# Altium integrated library sonata-board.IntLib: 101 symbols (continued)
## CMP-2000-05795-3 (continued)
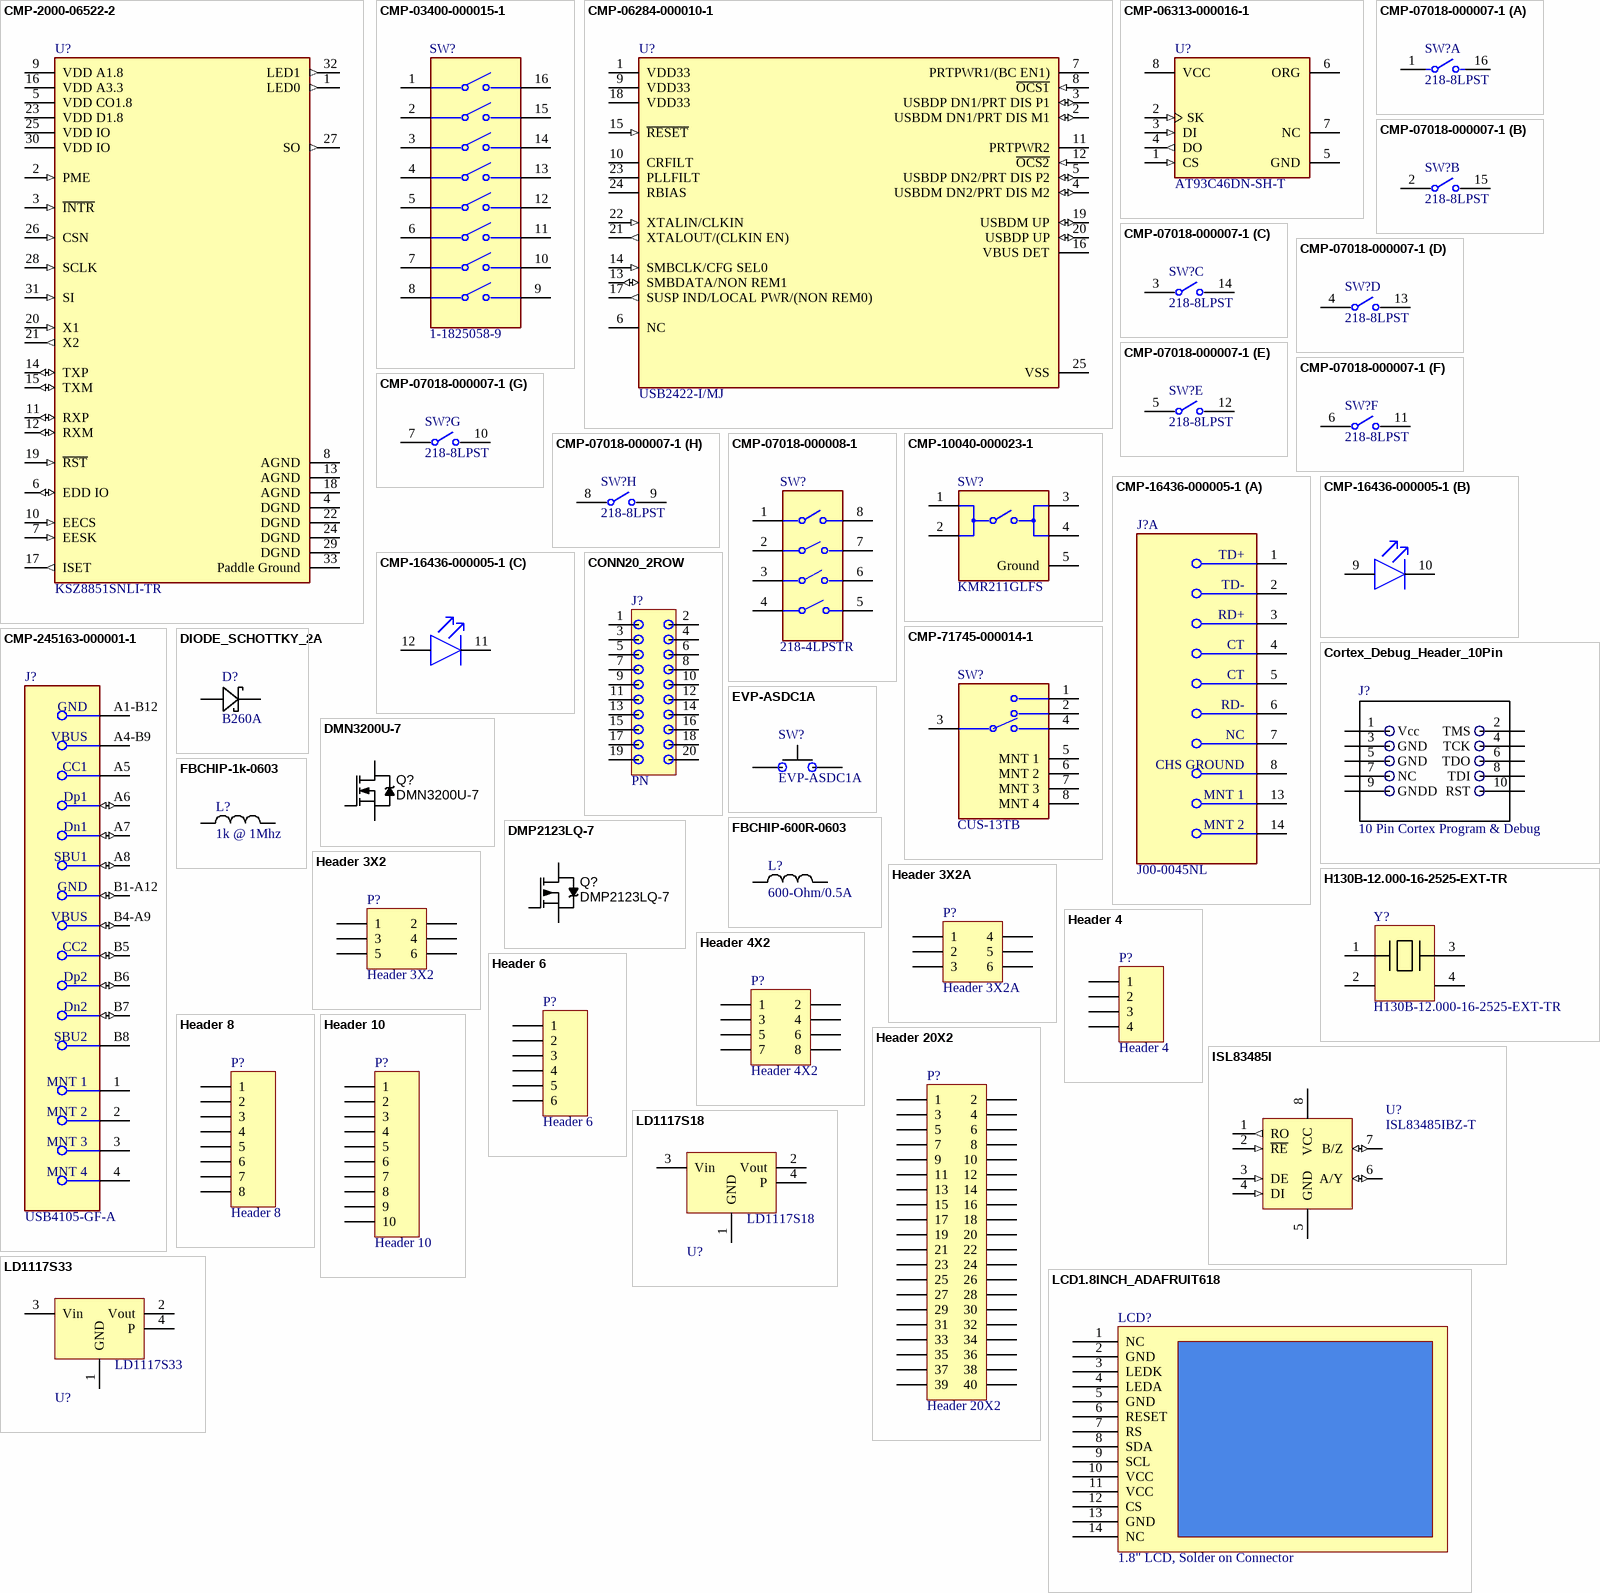
[diagram p2: symbols CMP-2000-06522-2 to LD1117S33]

## CMP-2000-06522-2
designator U?, comment KSZ8851SNLI-TR
IC ETHERNET CTLR 1PORT PCI 32MLF; Manufacturer: Microchip; Manufacturer Part Number: KSZ8851SNLITR; Data Rate: 100Mbps; Interface: SPI; Nominal Supply Current: 75mA; Max Supply Voltage: 3.5V; Number of Functions: 1; Operating Supply Voltage: 3.3V; Min Supply Voltage: 3.1V; Max Supply Current: 85mA; Height: 0.85mm; Package Quantity: 1000; Series: -; Max Operating Temperature: 85°C; Packaging: Tape and Reel; Case/Package: QFN; Radiation Hardening: No; Lead Free: Lead Free; REACH SVHC: No SVHC; Number of Transceivers: 1; Number of Pins: 32; Min Operating Temperature: -40°C; Supply Current: 75mA; Length: 5mm; Width: 5mm; Supply Voltage-Nom: 3.3V; Number of Ports: 1; Mount: Surface Mount
footprint FP-QFN55-32LD-PL-5-IPC_C
footprint FP-QFN55-32LD-PL-5-IPC_B
footprint FP-QFN55-32LD-PL-5-MFG
footprint FP-QFN55-32LD-PL-5-IPC_A
pins: 1 LED0 (out), 2 PME (in), 3 ~{INTR} (in), 4 DGND (power), 5 VDD CO1.8 (power), 6 EDD IO (io), 7 EESK (in), 8 AGND (power), 9 VDD A1.8 (power), 10 EECS (in), 11 RXP (io), 12 RXM (io), 13 AGND (power), 14 TXP (io), 15 TXM (io), 16 VDD A3.3 (power), 17 ISET (out), 18 AGND (power), 19 ~{RST} (in), 20 X1 (in), 21 X2 (out), 22 DGND (power), 23 VDD D1.8 (power), 24 DGND (power), 25 VDD IO (power), 26 CSN (in), 27 SO (out), 28 SCLK (in), 29 DGND (power), 30 VDD IO (power), 31 SI (in), 32 LED1 (out), 33 Paddle Ground

## CMP-03400-000015-1
designator SW?, comment 1-1825058-9
SWITCH SLIDE DIP SPST 100MA 24V; Manufacturer: TE Connectivity; Current Rating: 1A; Electromechanical Life: 1000Cycles; Contact Resistance: 50mΩ; Number Of Circuits: 8; Device Class L1: Electromechanical; Manufacturer Part Number: 1-1825058-9; Height: 5.1mm; ComponentLink2Description: Datasheet; Temperature Range High: +85°C; Digikey Description: SWITCH SLIDE DIP SPST 100MA 24V; Voltage Rating Dc: 24V; Package: 0; Automotive: No; ComponentLink2URL: https://www.te.com/commerce/DocumentDelivery/DDEController?Action=showdoc&DocId=Customer+Drawing%7F1825058%7FS5%7Fpdf%7FEnglish%7FENG_CD_1825058_S5.pdf%7F1-1825058-9; Octopart: https://octopart.com/1-1825058-9-te+connectivity-46507285; Temperature Range Low: -30°C; Device Class L2: Switches; Contact Current Rating: 100mA; Mount: Surface Mount; Temperature: -30°C to +85°C; Category: Switch; Device Class L3: DIP Switches; Lead Free: Yes; Throw Configuration: SPST; RoHS: TRUE
footprint FP-1-1825058-9-MFG
pins: 1, 2, 3, 4, 5, 6, 7, 8, 9, 10, 11, 12, 13, 14, 15, 16

## CMP-06284-000010-1
designator U?, comment USB2422-I/MJ
IC HUB CTLR USB 2.0 24QFN; Manufacturer: Microchip; Min Supply Voltage: 3V; Standoff Height: 0mm; Usb Standard: USB 2.0; Interface: I2C,USB,SMBus; Number Of Ports: 2; Max Supply Voltage: 3.6V; Nominal Supply Current: 29-70mA; Device Class L1: Integrated Circuits (ICs); ComponentLink2URL: http://ww1.microchip.com/downloads/en/DeviceDoc/00001726B.pdf; Temperature: -40°C to +85°C; Lead Free: Yes; Category: IC; RoHS: TRUE; Digikey Description: IC HUB CTLR USB 2.0 24QFN; Device Class L2: Interface ICs; Height: 1mm; Device Class L3: USB Interface ICs; Temperature Range High: +85°C; Automotive: No; Ipc Land Pattern Name: QFN50P400X400X90-24; Temperature Range Low: -40°C; Manufacturer Part Number: USB2422-I/MJ; Mouser Description: Microchip USB2422-I/MJ; USB Controller; USB 2.0; 3 - 3.6 V; 24-Pin SQFN; Package: 24-S4QFN-4x4B-0.5P; Ambient Temperature Range Low: -40°C; ComponentLink2Description: Datasheet; Ambient Temperature Range High: +85°C; Octopart: https://octopart.com/usb2422-i%2Fmj-microchip-29030614
footprint FP-24-S4QFN-4x4B-0_5P-MFG
footprint FP-24-S4QFN-4x4B-0_5P-IPC_C
footprint FP-24-S4QFN-4x4B-0_5P-IPC_B
footprint FP-24-S4QFN-4x4B-0_5P-IPC_A
pins: 1 VDD33 (power), 2 USBDM DN1/PRT DIS M1 (io), 3 USBDP DN1/PRT DIS P1 (io), 4 USBDM DN2/PRT DIS M2 (io), 5 USBDP DN2/PRT DIS P2 (io), 6 NC, 7 PRTPWR1/(BC EN1) (power), 8 ~{OCS1} (in), 9 VDD33 (power), 10 CRFILT, 11 PRTPWR2 (power), 12 ~{OCS2} (in), 13 SMBDATA/NON REM1 (io), 14 SMBCLK/CFG SEL0 (in), 15 ~{RESET} (in), 16 VBUS DET (power), 17 SUSP IND/LOCAL PWR/(NON REM0) (out), 18 VDD33 (power), 19 USBDM UP (io), 20 USBDP UP (io), 21 XTALOUT/(CLKIN EN) (out), 22 XTALIN/CLKIN (in), 23 PLLFILT, 24 RBIAS, 25 VSS (power)

## CMP-06313-000016-1
designator U?, comment AT93C46DN-SH-T
IC EEPROM 1K SPI 2MHZ 8SOIC; Manufacturer: Microchip; Manufacturer: Microchip / Atmel; Nominal Supply Current: 0.5mA; Memory Size: 1Kbits; Access Time: 1000ns; Max Supply Voltage: 5.5V; Interface: Other; Standoff Height: 0.1mm; Min Supply Voltage: 1.8V; Category: IC; Temperature Range High: +85°C; Mouser Description: EEPROM Serial-3Wire 1K-Bit 128 x 8/64 x 16 2.5V/3.3V/5V 8-Pin SOIC T/R; Ipc Land Pattern Name: SOIC127P600X175-8; Temperature Range Low: -40°C; Temperature: -40°C to +85°C; Digikey Description: IC EEPROM 1K SPI 2MHZ 8SOIC; Lead Free: Yes; Device Class L2: Memory; ComponentLink2URL: http://ww1.microchip.com/downloads/en/DeviceDoc/20006224B.pdf; Automotive: No; Device Class L3: EEPROM; Package: C04-057-SN; Octopart: https://octopart.com/at93c46dn-sh-t-microchip-77759177; RoHS: TRUE; Memory Type: EEPROM; Height: 1.75mm; Manufacturer Part Number: AT93C46DN-SH-T; ComponentLink2Description: Datasheet; Frequency: 2MHz; Device Class L1: Integrated Circuits (ICs)
footprint FP-C04-057-SN-MFG
footprint FP-C04-057-SN-IPC_C
footprint FP-C04-057-SN-IPC_B
footprint FP-C04-057-SN-IPC_A
pins: 1 CS (in), 2 SK (in), 3 DI (in), 4 DO (out), 5 GND (power), 6 ORG, 7 NC, 8 VCC (power)

## CMP-07018-000007-1
designator SW?, comment 218-8LPST
SWITCH SLIDE DIP SPST 25MA 24V; Manufacturer: CTS; Number of Positions: 8; Pitch: 0.05inch; Actuator Type: Slide (Standard); Electrical Life: 1000Cycles; Washable: Yes; Contact Resistance: 100mR; Radiation Hardening: No; Packaging: Rail/Tube; Length: 0.446inch; Depth: 8.44mm; Max Voltage Rating (DC): 24V; Lead Free: Lead Free; Mount: Surface Mount; RoHS Compliant: Yes; Series: 218; Max Operating Temperature: 85°C; Termination: Gull Wing; Voltage Rating (DC): 24V; Current Rating: 25mA; Contact Plating: Gold; Min Operating Temperature: -55°C; Terminal Pitch: 1.27mm; Contact Material: Copper; Throw Configuration: SPST; Orientation: Straight; Max Current Rating: 25mA; Height: 2.65mm; Package Quantity: 40; Manufacturer Part Number: 218-8LPST
footprint FP-218-8LPST-MFG
part A pins: 1, 16
part B pins: 2, 15
part C pins: 3, 14
part D pins: 4, 13
part E pins: 5, 12
part F pins: 6, 11
part G pins: 7, 10
part H pins: 8, 9

## CMP-07018-000008-1
designator SW?, comment 218-4LPSTR
SWITCH SLIDE DIP SPST 25MA 24V; Manufacturer: CTS; Number of Positions: 4; Washable: Yes; Pitch: 0.05inch; Actuator Type: Slide (Standard); Electrical Life: 1000Cycles; Current Rating: 25mA; Contact Material: Copper; Max Current Rating: 25mA; Termination: Gull Wing; Throw Configuration: SPST; Mount: Surface Mount; Radiation Hardening: No; Contact Plating: Gold; Length: 0.246inch; Depth: 8.44mm; Package Quantity: 2000; Packaging: Tape and Reel; Series: 218; Lead Free: Lead Free; Voltage Rating (DC): 24V; Min Operating Temperature: -55°C; RoHS Compliant: Yes; Mechanical Life: 1000Cycles; Max Operating Temperature: 85°C; Orientation: Straight; Max Voltage Rating (DC): 24V; Manufacturer Part Number: 218-4LPSTR
footprint FP-218-4LPSTR-MFG
pins: 1, 2, 3, 4, 5, 6, 7, 8

## CMP-10040-000023-1
designator SW?, comment KMR211GLFS
SWITCH TACTILE SPST-NO 0.05A 32V; Manufacturer: ITT C&K; Switch Function: Off-Mom; Throw Configuration: SPST; Switch Travel: 0.2mm; Current Rating: 50mA; Illumination Type: Non-Illuminated; Actuator Length: 0.5mm; Power Rating: 1W; Operating Force: 1.2N; Actuator Type: Standard; Mechanical Life: 200000Cycles; REACH SVHC: No SVHC; Voltage Rating (DC): 32V; Length: 2.8mm; Min Operating Temperature: -40°C; Mount: Surface Mount; Max Voltage Rating (DC): 32V; Width: 2.8mm; Depth: 4.6mm; Packaging: Tape and Reel; Lead Free: Lead Free; Contact Material: Silver; Termination: Gull Wing; Package Quantity: 1; Contact Current Rating: 50mA; Orientation: Straight; Max Operating Temperature: 85°C; Radiation Hardening: No; Max Current Rating: 50mA; Contact Plating: Silver; Manufacturer Part Number: KMR211GLFS
footprint FP-KMR211GLFS-MFG
pins: 1, 2, 3, 4, 5 Ground (power)

## CMP-16436-000005-1
designator J?, comment J00-0045NL
CONN JACK 1PORT 100 BASE-TX PCB; Manufacturer: Pulse; Manufacturer Part Number: J000045NL; Number of Cores per Jack: 4; Gender: Female; Connector Type: RJ45; Number of Positions Loaded: 8; Current Rating: 8mA; Pitch: 2.54mm; Shielding: Shielded; Direction: Down; Number of Ports: 1; Depth: 21.59mm; Radiation Hardening: No; Contact Material: Bronze; Contact Plating: Gold; Mount: Through Hole; Max Operating Temperature: 70°C; Packaging: Rail/Tube; Color: Green; Number of Contacts: 8; Lead Free: Lead Free; Series: STARJACK™ J00; Package Quantity: 30; Length: 16.26mm; Number of Rows: 1; Min Operating Temperature: 0°C; Termination: Solder; Orientation: Right Angle; Housing Material: Thermoplastic
footprint FP-J00-0045NL-MFG
part A pins: 1 TD+, 2 TD-, 3 RD+, 4 CT, 5 CT, 6 RD-, 7 NC, 8 CHS GROUND, 13 MNT 1, 14 MNT 2
part B pins: 9 GREEN A, 10 GREEN C
part C pins: 11 YELLOW CATHODE, 12 YELLOW ANODE

## CMP-71745-000014-1
designator SW?, comment CUS-13TB
SWITCH SLIDE SP3T 300MA 4V; Manufacturer: Nidec Copal; Actuator Length: 1.5mm; Electrical Life: 10000Cycles; Max Voltage Rating (DC): 20V; Switch Function: On-On-On; Actuator Material: Nylon; Actuator Type: Standard; Contact Style: Non-Shorting; Contact Plating: Gold; Termination: Gull Wing; Radiation Hardening: No; Series: CUS; Max Operating Temperature: 70°C; Mount: Surface Mount; Switch Travel: 1.5mm; Packaging: Tape and Reel; Min Operating Temperature: -20°C; Contact Material: Copper Alloy; Orientation: Right Angle; Voltage Rating (DC): 4V; RoHS Compliant: Yes; Current Rating: 300mA; Throw Configuration: SP3T; Manufacturer Part Number: CUS-13TB
footprint FP-CUS-13TB-MFG
pins: 1, 2, 3 C, 4, 5 MNT 1, 6 MNT 2, 7 MNT 3, 8 MNT 4

## CMP-245163-000001-1
designator J?, comment USB4105-GF-A
CONN RCPT USB2.0 TYPEC 5A; Manufacturer: GCT; Manufacturer: Global Connector Technology; Voltage Rating: 20V; Is Female: yes; Current Rating: 5/6.25/1.25/0.25A; Number Of Contacts: 16; Conn Orientation: Right Angle; Device Class L1: Connectors; Category: Conn; Lead Free: Yes; RoHS: TRUE; Temperature Range High: +85°C; Digikey Description: CONN RCPT USB2.0 TYPEC 5A; Device Class L3: unset; ComponentLink2Description: Datasheet; Manufacturer Part Number: USB4105-GF-A; Package: 0; Usb Standard: USB 2.0; Device Class L2: USB Connectors; Automotive: No; Temperature Range Low: -40°C; Height: 3.46mm; Temperature: -40°C to +85°C; Contact Material: Gold,Nickel; ComponentLink2URL: https://gct.co/files/drawings/usb4105.pdf; Octopart: https://octopart.com/usb4105-gf-a-gct-106627878
footprint FP-USB4105-GF-A-MFG
pins: 1 MNT 1 (power), 2 MNT 2 (power), 3 MNT 3 (power), 4 MNT 4 (power), A1-B12 GND (power), A4-B9 VBUS (power), A5 CC1 (power), A6 Dp1 (io), A7 Dn1 (io), A8 SBU1 (io), B1-A12 GND (io), B4-A9 VBUS (io), B5 CC2 (io), B6 Dp2 (io), B7 Dn2 (io), B8 SBU2 (power)

## CONN20_2ROW
designator J?, comment PN
Header, 2-Row, 20-pin, 0.1"; Part Number: CONN20_2ROW; Component Group: Connector; Pin Count: 20; Mounting Technology: SMT; Component Kind: Standard; Component Type: Standard
footprint CONN_10x2_SHROUDED_2.54mm
pins: 1, 2, 3, 4, 5, 6, 7, 8, 9, 10, 11 9, 12 10, 13 9, 14 10, 15 9, 16 10, 17 9, 18 10, 19 9, 20 10

## Cortex_Debug_Header_10Pin
designator J?, comment 10 Pin Cortex Program & Debug
10 Pin Cortex Program & Debug 0.5mm pitch; Part Number: Cortex_Debug_Header_10Pin; Manufacture Part Number 1: 20021121-00010C4LF; Component Group: Connector; PP Material Stack: 0; Footprint: 0.5mm_SMD_Header_5x2; Pin Count: 10; Supplier 1: Digi-Key; Supplier Part Number 1: 609-3695-1-ND; Mounting Technology: SMT; RoHS: Yes; Component Kind: Standard; Component Type: Standard; PP Rotation: 0
footprint 0.5mm_SMD_Header_5x2
pins: 1 Vcc, 2 TMS, 3 GND, 4 TCK, 5 GND, 6 TDO, 7 NC, 8 TDI, 9 GNDD, 10 RST

## DIODE_SCHOTTKY_2A
designator D?, comment B260A
DIODE SCHOTTKY 60V 2A SMA; Part Number: DIODE_SCHOTTKY_2A; Manufacture 1: Diodes Incorporated; Manufacture Part Number 1: B260A-13-F; PP Material Stack: 0; Component Group: Diode; Footprint: DO-214AC; Pin Count: 2; Supplier 1: Digi-Key; Supplier Part Number 1: B260A-FDICT-ND; Mounting Technology: SMT; RoHS: Yes; Component Kind: Standard; Component Type: Standard; PP Rotation: 0
footprint DIOM4326X23N
pins: A, K

## DMN3200U-7
designator Q?
MOSFET N-CH 30V 2.2A SOT23-3; Manufacture 1: Diodes Inc.; Rated Power: 3A; PP Material Stack: 0; Part Number: DMN3200U-7; Component Group: MOSFET; Footprint: SOT23; Manufacture Part Number 1: DMN3200U-7; Pin Count: 3; Supplier 1: Digi-Key; Supplier Part Number 1: DMN3200U-7DICT-ND; Rated Voltage: 30V; Mounting Technology: SMT; RoHS: Yes; Component Kind: Standard; Component Type: Standard; PP Rotation: 0
footprint SOT95P245X110-3M
pins: 1 G, 2 S, 3 D

## DMP2123LQ-7
designator Q?
P-Channel, 3A, Logic Level; Manufacture 1: Diodes Inc.; Component Group: MOSFET; Part Number: DMP2123LQ-7; Footprint: SOT23; Manufacture Part Number 1: DMP2123LQ-7; Pin Count: 3; Supplier 1: Digi-Key; Supplier Part Number 1: DMP2123LQ-7DICT-ND; Mounting Technology: SMT; Component Kind: Standard; Component Type: Standard
footprint SOT95P245X110-3M
pins: 1 G, 2 S, 3 D

## EVP-ASDC1A
designator SW?
Pushbutton, SMD, 2.5NM force, NO; Manufacture 1: Panasonic; Component Group: Switch; Part Number: EVP-ASDC1A; Footprint: EVPAS; Manufacture Part Number 1: EVP-ASDC1A; Pin Count: 2; Supplier 1: Digi-Key; Supplier Part Number 1: P16856CT-ND; Mounting Technology: SMT; Component Kind: Standard; Component Type: Standard
footprint EVPAS
pins: 1 IN, 2 IN

## FBCHIP-1k-0603
designator L?, comment 1k @ 1Mhz
Ferrite Beads HI CUR CHIP BD 0603 1000OHMS 25%; Part Number: FBCHIP-1k-0603; Manufacture 1: Taiyo Yuden; Manufacture Part Number 1: FBMH1608HM102-T / FBMH1608HM102-T / FBMH1608HM102-T / FBMH1608HM102-T; Component Group: Inductor; PP Material Stack: 0; Footprint: 0603; Pin Count: 2; Supplier 1: Mouser; Supplier Part Number 1: 963-FBMH1608HM102-T; Mounting Technology: SMT; RoHS: Yes; Component Kind: Standard; Component Type: Standard; PP Rotation: 0
footprint IND_0603
pins: 1, 2

## FBCHIP-600R-0603
designator L?, comment 600-Ohm/0.5A
600 Ohm @ 100 MHz, 0.5A rated FB; Part Number: FBCHIP-600R-0603; Manufacture 1: Murata Electronics; Manufacture Part Number 1: BLM18AG601SN1D; Component Group: Inductor; Value: 600R/0.5A; Case-EIA: 0603; Case-Metric: 1608; PP Material Stack: 0; Footprint: 0603; Pin Count: 2; Supplier 1: Digi-Key; Supplier Part Number 1: 490-1014-2-ND; Rated Power: 0.5A; Component Kind: Standard; Component Type: Standard; PP Rotation: 0
footprint IND_0603 (Chip Inductor, 2-Leads, Body 1.60x0.80mm, IPC Medium Density)
pins: 1, 2

## H130B-12.000-16-2525-EXT-TR
designator Y?
12MHz ±25ppm Crystal 16pF 35 Ohms 4-SMD, No Lead; Manufacture 1: Raltron Electronics; Value: 12.000MHz; PP Material Stack: 0; Supplier 1: Digi-Key; Stock 1: 4955; Pricing 1: 1=0.590000, 10=0.488000, 50=0.439400, 100=0.390600, 500=0.371100 (USD); Supplier Part Number 1: 2151-H130B-12.000-16-2525-EXT-TR-ND; .Checked SCH: *; .Checked PCB: *; Manufacturer Part Number: H130B-12.000-16-2525-EXT-TR; Part Number: H130B-12.000-16-2525-EXT-TR; Component Group: Crystal; Footprint: 5x3.2mm; Manufacture Part Number 1: H130B-12.000-16-2525-EXT-TR; Pin Count: 4; Mounting Technology: SMT; Component Kind: Standard; Component Type: Standard; PP Rotation: 0
footprint 5x3.2MM XTAL
pins: 1, 2, 3, 4

## Header 3X2
designator P?
Header, 3-Pin, Dual row; LatestRevisionDate: 17-Jul-2002; LatestRevisionNote: Re-released for DXP Platform.; Publisher: Altium Limited
footprint HDR2X3
signal-integrity model Connector
footprint HDR2X3_SLW-103-01-T-D (Footprint not found)
footprint HDR2X3_XG8T-0641 (Connector; Header; 3x2 Position)
pins: 1, 2, 3, 4, 5, 6

## Header 3X2A
designator P?
Header, 3-Pin, Dual row; LatestRevisionDate: 17-Jul-2002; LatestRevisionNote: Re-released for DXP Platform.; Publisher: Altium Limited
footprint HDR2X3_CEN
signal-integrity model Connector
pins: 1, 2, 3, 4, 5, 6

## Header 4
designator P?
Header, 4-Pin; LatestRevisionDate: 17-Jul-2002; LatestRevisionNote: Re-released for DXP Platform.; Publisher: Altium Limited
footprint HDR1X4
signal-integrity model Connector
pins: 1, 2, 3, 4

## Header 4X2
designator P?
Header, 4-Pin, Dual row; LatestRevisionDate: 17-Jul-2002; LatestRevisionNote: Re-released for DXP Platform.; Publisher: Altium Limited
footprint HDR2X4 (Footprint not found)
signal-integrity model Connector
footprint HDR2X4_XG8T-0841 (Connector; Header; 4x2 Position)
pins: 1, 2, 3, 4, 5, 6, 7, 8

## Header 6
designator P?
Header, 6-Pin; LatestRevisionDate: 17-Jul-2002; LatestRevisionNote: Re-released for DXP Platform.; Publisher: Altium Limited
footprint HDR1X6 (Footprint not found)
signal-integrity model Connector
footprint HDR1X6_SLW-106-01-T-S (Connector; Header; 6 Position)
pins: 1, 2, 3, 4, 5, 6

## Header 8
designator P?
Header, 8-Pin; LatestRevisionDate: 17-Jul-2002; LatestRevisionNote: Re-released for DXP Platform.; Publisher: Altium Limited
footprint HDR1X8 (Footprint not found)
signal-integrity model Connector
footprint HDR1X8_SLW-108-01-T-S (Connector; Header; 8 Position)
pins: 1, 2, 3, 4, 5, 6, 7, 8

## Header 10
designator P?
Header, 10-Pin; LatestRevisionDate: 17-Jul-2002; LatestRevisionNote: Re-released for DXP Platform.; Publisher: Altium Limited
footprint HDR1X10 (Footprint not found)
signal-integrity model Connector
footprint HDR1X10_SLW-110-01-T-S (Connector; Header; 10 Position)
pins: 1, 2, 3, 4, 5, 6, 7, 8, 9, 10

## Header 20X2
designator P?
Header, 20-Pin, Dual row; LatestRevisionDate: 17-Jul-2002; LatestRevisionNote: Re-released for DXP Platform.; Publisher: Altium Limited
footprint HDR2X20 (Footprint not found)
signal-integrity model Connector
footprint HDR2X20_861400402YO2LF (Connector; Header; 20x2 Position)
pins: 1, 2, 3, 4, 5, 6, 7, 8, 9, 10, 11, 12, 13, 14, 15, 16, 17, 18, 19, 20, 21, 22, 23, 24, 25, 26, 27, 28, 29, 30, 31, 32, 33, 34, 35, 36, 37, 38, 39, 40

## ISL83485I
designator U?, comment ISL83485IBZ-T
IC TXRX RS422/RS485; Manufacture 1: Renesas; Component Group: Digital IC; Part Number: ISL83485I; Footprint: SOIC8; Manufacture Part Number 1: ISL83485IBZ-T; Pin Count: 8; Supplier 1: Digi-Key; Supplier Part Number 1: ISL83485IBZ-TCT-ND; Mounting Technology: SMT; RoHS: Yes; Component Kind: Standard; Component Type: Standard
footprint SOIC8_NARROW
pins: 1 RO (out), 2 ~{RE} (in), 3 DE (in), 4 DI (in), 5 GND (power), 6 A/Y (io), 7 B/Z (io), 8 VCC (power)

## LCD1.8INCH_ADAFRUIT618
designator LCD?, comment 1.8" LCD, Solder on Connector
Part Number: LCD1.8INCH_ADAFRUIT618; Component Group: Optical; PP Material Stack: 0; Pin Count: 14; Component Kind: Standard; Component Type: Standard; PP Rotation: 0; PP Rotation1: 0
footprint ADAFRUIT618
pins: 1 NC, 2 GND, 3 LEDK, 4 LEDA, 5 GND, 6 RESET, 7 RS, 8 SDA, 9 SCL, 10 VCC, 11 VCC, 12 CS, 13 GND, 14 NC

## LD1117S18
designator U?
IC REG LIN POS 1.8V 800MA SOT223; Manufacture 1: STMicroelectronics; Manufacture Part Number 1: LD1117S18TR; Component Group: Analog IC; Rated Voltage: 15V; PP Material Stack: 0; Part Number: LD1117S18; Footprint: SOT-223; Pin Count: 3; Supplier 1: Digi-Key; Supplier Part Number 1: 497-7308-1-ND; Mounting Technology: SMT; RoHS: Yes; Component Kind: Standard; Component Type: Standard; PP Rotation: 0
footprint SOT-223
pins: 1 GND, 2 Vout, 3 Vin, 4 P

## LD1117S33
designator U?
IC REG LIN POS 3.3V 800MA SOT223; Manufacture 1: STMicroelectronics; Manufacture Part Number 1: LD1117S33TR; Component Group: Analog IC; Rated Voltage: 15V; PP Material Stack: 0; Part Number: LD1117S33; Footprint: SOT-223; Pin Count: 3; Supplier 1: Digi-Key; Supplier Part Number 1: 497-1242-1-ND; Mounting Technology: SMT; RoHS: Yes; Component Kind: Standard; Component Type: Standard; PP Rotation: 0
footprint SOT-223
pins: 1 GND, 2 Vout, 3 Vin, 4 P

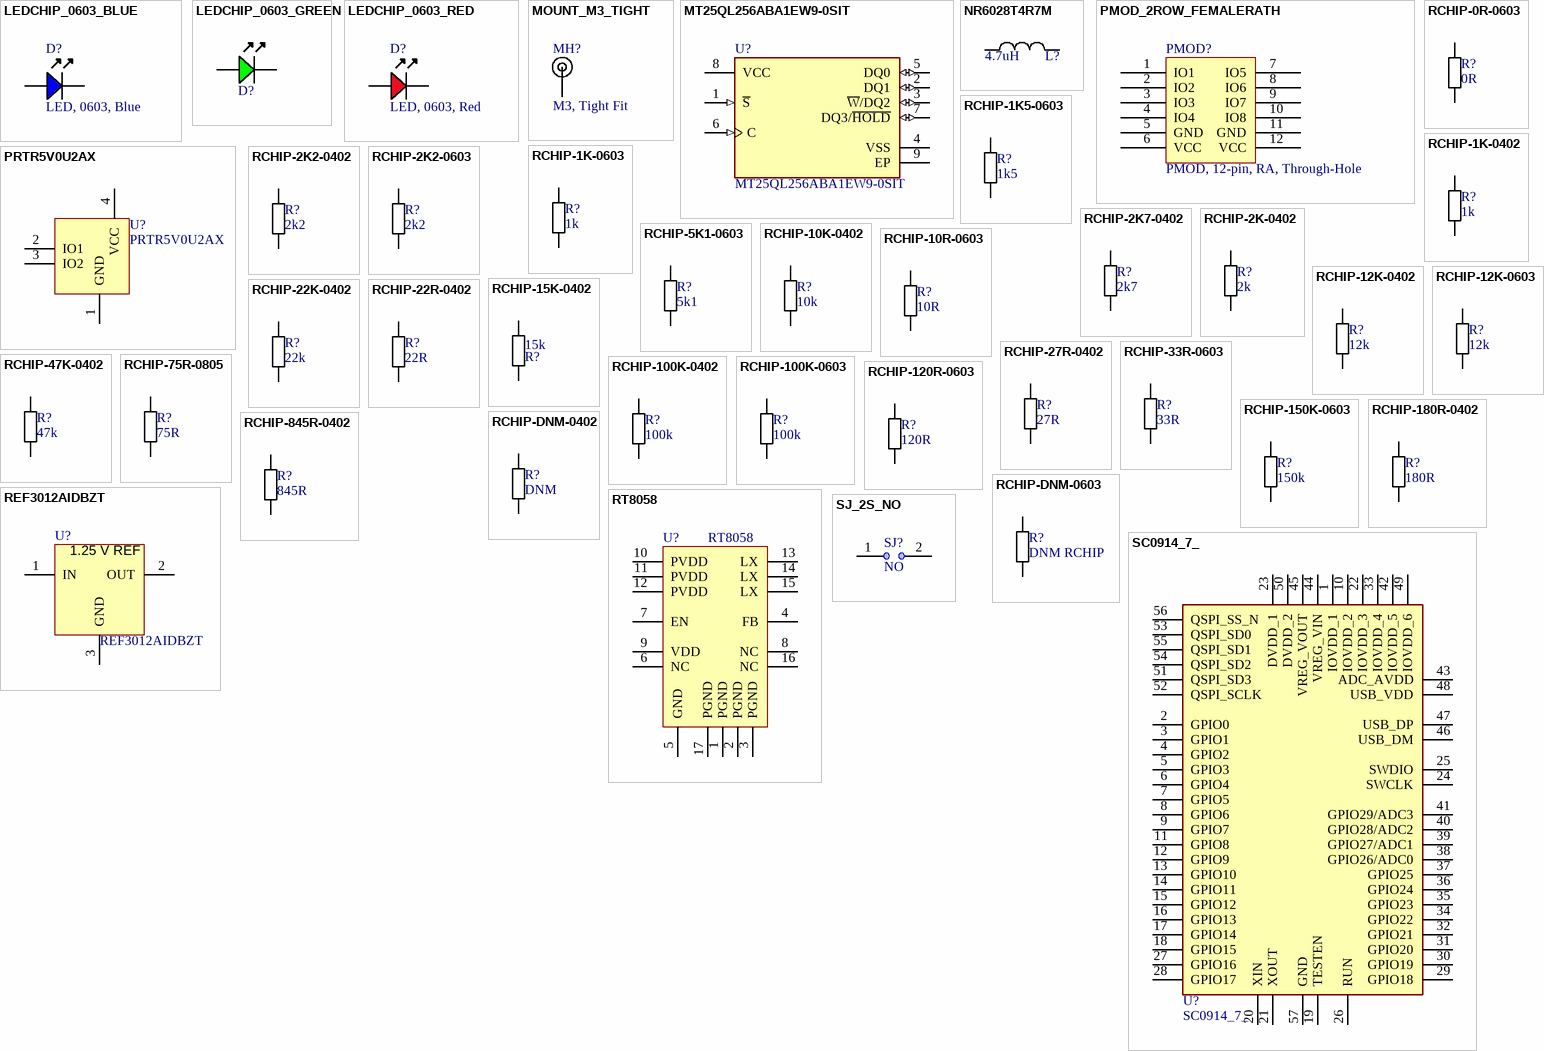
[diagram p3: symbols LEDCHIP_0603_BLUE to SJ_2S_NO]

## LEDCHIP_0603_BLUE
designator D?, comment LED, 0603, Blue
Chip LED, Blue; Part Number: LEDCHIP_0603_BLUE; Manufacture 1: Kingbright; Manufacture Part Number 1: APT1608QBC/D; Component Group: Optical; Footprint: LED-0603-BLUE; Pin Count: 2; Supplier 1: Digi-Key; Supplier Part Number 1: 754-1434-1-ND; Mounting Technology: SMT; Component Kind: Standard; Component Type: Standard
footprint LED-0603-BLUE
pins: A, K

## LEDCHIP_0603_GREEN
designator D?, comment LED, 0603, Green  (value not drawn)
Chip LED, Green; Part Number: LEDCHIP_0603_GREEN; Manufacture 1: Kingbright; Manufacture Part Number 1: APT1608CGCK; Component Group: Optical; PP Material Stack: 16; PP Rotation: -90; Footprint: LED-0603-GREEN; Pin Count: 2; Supplier 1: Digi-Key; Supplier Part Number 1: 754-1116-1-ND; Mounting Technology: SMT; Component Kind: Standard; Component Type: Standard
footprint LED-0603-GREEN
pins: A, K

## LEDCHIP_0603_RED
designator D?, comment LED, 0603, Red
Chip LED, Red; Part Number: LEDCHIP_0603_RED; Manufacture 1: Kingbright; Manufacture Part Number 1: APT1608SURCK; Component Group: Optical; PP Material Stack: 15; PP Rotation: -90; Footprint: LED-0603-RED; Pin Count: 2; Supplier 1: Digi-Key; Supplier Part Number 1: 754-1123-1-ND; Mounting Technology: SMT; Component Kind: Standard; Component Type: Standard
footprint LED-0603-RED
pins: A, K

## MOUNT_M3_TIGHT
designator MH?, comment M3, Tight Fit
Machine screw M3 Mounting Hole; Part Number: MOUNT_M3_TIGHT; Component Group: Mechanical; PP Material Stack: 0; Footprint: MOUNT_M3_TIGHT; Pin Count: 1; Component Kind: Mechanical; Component Type: Mechanical; PP Rotation: 0
footprint MOUNT_M3_TIGHT
pins: 1

## MT25QL256ABA1EW9-0SIT
designator U?
IC FLASH 256M SPI 133MHZ 8WPDFN; Manufacture 1: Micron; Component Group: Digital IC; PP Material Stack: 0; Part Number: MT25QL256ABA1EW9-0SIT; Footprint: WSON-8x6; Manufacture Part Number 1: MT25QL256ABA1EW9-0SIT; Pin Count: 9; Supplier 1: Digi-Key; Supplier Part Number 1: 557-1984-1-ND; Mounting Technology: SMT; RoHS: Yes; Component Kind: Standard; Component Type: Standard; PP Rotation: 0; PP Rotation1: 0
footprint WSON68_Micron
pins: 1 ~{S} (in), 2 DQ1 (io), 3 ~{W}/DQ2 (io), 4 VSS (power), 5 DQ0 (io), 6 C (in), 7 DQ3/~{HOLD} (io), 8 VCC (power), 9 EP (power)

## NR6028T4R7M
designator L?, comment 4.7uH
fixed ind, ferrite, shielded; Part Number: NR6028T4R7M; Manufacture 1: Taiyo Yuden; Component Group: Inductor; Case-Metric: 6060; Footprint: SMD,6x6mm; Manufacture Part Number 1: NR6028T4R7M; Pin Count: 2; Supplier 1: Digi-Key; Supplier Part Number 1: 587-2100-1-ND; Value: 4.7uH; Mounting Technology: SMT; Component Kind: Standard; Component Type: Standard
footprint NR6028
pins: 1, 2

## PMOD_2ROW_FEMALERATH
designator PMOD?, comment PMOD, 12-pin, RA, Through-Hole
Part Number: PMOD_2ROW_FEMALERATH; Component Group: Connector; PP Material Stack: 0; Pin Count: 12; Supplier 1: Digi-Key; Supplier Part Number 1: SAM1215-06-ND; Component Kind: Standard; Component Type: Standard; PP Rotation: 0; PP Rotation1: 0
footprint SAMTEC_SSW_106_02_X_D_RA_PMOD
pins: 1 IO1, 2 IO2, 3 IO3, 4 IO4, 5 GND, 6 VCC, 7 IO5, 8 IO6, 9 IO7, 10 IO8, 11 GND, 12 VCC

## PRTR5V0U2AX
designator U?
USB 2.0 high-speed ESD; Component Group: Diode; Supplier 1: Digi-Key; Supplier Part Number 1: 568-7445-1-ND; Part Number: PRTR5V0U2AX; Footprint: SOT143B; Pin Count: 4; Component Kind: Standard; Component Type: Standard
footprint SOT143B
pins: 1 GND (power), 2 IO1, 3 IO2, 4 VCC (power)

## RCHIP-0R-0603
designator R?, comment 0R
0R, 0603, 1/10W; Part Number: RCHIP-0R-0603; Manufacture 1: Yageo; Manufacture Part Number 1: RC0603FR-070RL; Component Group: Resistor; Case-EIA: 0603; Case-Metric: 1608; Rated Power: 0.1W; Rated Voltage: 75VDC; Tolerance: 1%; Footprint: 0603; Pin Count: 2; Supplier 1: Digi-Key; Supplier Part Number 1: 311-0.0HRCT-ND; Value: 0R; Mounting Technology: SMT; Temperature Range: -55C to 155C; Component Kind: Standard; Component Type: Standard
footprint RESC1608X55N
pins: 1, 2

## RCHIP-1K5-0603
designator R?, comment 1k5
1k5 res, 0603, 1%, 1/10W; Part Number: RCHIP-1K5-0603; Manufacture 1: Yageo; Manufacture Part Number 1: RC0603FR-071K5L; Component Group: Resistor; Case-EIA: 0603; Case-Metric: 1608; Rated Power: 0.1W; Rated Voltage: 75VDC; Footprint: 0603; Pin Count: 2; Supplier 1: Digi-Key; Supplier Part Number 1: 311-1.50KHRCT-ND; Value: 1k5; Tolerance: 1%; Mounting Technology: SMT; Temperature Range: -55C to 155C; Component Kind: Standard; Component Type: Standard
footprint RESC1608X55N
pins: 1, 2

## RCHIP-1K-0402
designator R?, comment 1k
1k res, 0402, 1%, 1/16W; Part Number: RCHIP-1K-0402; Manufacture 1: Yageo; Manufacture Part Number 1: RC0402FR-071KL; Component Group: Resistor; Case-EIA: 0402; Case-Metric: 1005; Rated Power: 0.063W; Rated Voltage: 75VDC; Footprint: 0402; Pin Count: 2; Supplier 1: Digi-Key; Supplier Part Number 1: 311-1.00KLRCT-ND; Value: 1k; Tolerance: 1%; Mounting Technology: SMT; Temperature Range: -55C to 155C; Component Kind: Standard; Component Type: Standard
footprint RESC1005X40N
pins: 1, 2

## RCHIP-1K-0603
designator R?, comment 1k
1k res, 0603, 1%, 1/10W; Part Number: RCHIP-1K-0603; Manufacture 1: Yageo; Manufacture Part Number 1: RC0603FR-071KL; Component Group: Resistor; Case-EIA: 0603; Case-Metric: 1608; Rated Power: 0.1W; Rated Voltage: 75VDC; Footprint: 0603; Pin Count: 2; Supplier 1: Digi-Key; Supplier Part Number 1: 311-1.00KHRCT-ND; Value: 1k; Tolerance: 1%; Mounting Technology: SMT; Temperature Range: -55C to 155C; Component Kind: Standard; Component Type: Standard
footprint RESC1608X55N
pins: 1, 2

## RCHIP-2K2-0402
designator R?, comment 2k2
2k2 res, 0402, 1%, 1/16W; Part Number: RCHIP-2K2-0402; Manufacture 1: Yageo; Manufacture Part Number 1: RC0402FR-072K2L; Component Group: Resistor; Case-EIA: 0402; Case-Metric: 1005; Rated Power: 0.063W; Rated Voltage: 75VDC; Footprint: 0402; Pin Count: 2; Supplier 1: Digi-Key; Supplier Part Number 1: 311-2.20KLRCT-ND; Value: 2k2; Tolerance: 1%; Mounting Technology: SMT; Temperature Range: -55C to 155C; Component Kind: Standard; Component Type: Standard
footprint RESC1005X40N
pins: 1, 2

## RCHIP-2K2-0603
designator R?, comment 2k2
2k2 res, 0603, 1%, 1/10W; Part Number: RCHIP-2K2-0603; Manufacture 1: Yageo; Manufacture Part Number 1: RC0603FR-072K2L; Component Group: Resistor; Case-EIA: 0603; Case-Metric: 1608; Rated Power: 0.1W; Rated Voltage: 75VDC; Footprint: 0603; Pin Count: 2; Supplier 1: Digi-Key; Supplier Part Number 1: 311-2.20KHRCT-ND; Value: 2k2; Tolerance: 1%; Mounting Technology: SMT; Temperature Range: -55C to 155C; Component Kind: Standard; Component Type: Standard
footprint RESC1608X55N
pins: 1, 2

## RCHIP-2K7-0402
designator R?, comment 2k7
2k7 res, 0402, 1%, 1/16W; Part Number: RCHIP-2K7-0402; Manufacture 1: Yageo; Manufacture Part Number 1: RC0402FR-072K7L; Component Group: Resistor; Case-EIA: 0402; Case-Metric: 1005; Rated Power: 0.063W; Rated Voltage: 75VDC; Footprint: 0402; Pin Count: 2; Supplier 1: Digi-Key; Supplier Part Number 1: 311-2.70KLRCT-ND; Value: 2k7; Tolerance: 1%; Mounting Technology: SMT; Temperature Range: -55C to 155C; Component Kind: Standard; Component Type: Standard
footprint RESC1005X40N (Chip Resistor, Body 1.0x0.5mm, EIA 0402, IPC Medium Density)
pins: 1, 2

## RCHIP-2K-0402
designator R?, comment 2k
2k res, 0402, 1%, 1/16W; Part Number: RCHIP-2K-0402; Manufacture 1: Yageo; Manufacture Part Number 1: RC0402FR-072KL; Component Group: Resistor; Case-EIA: 0402; Case-Metric: 1005; Rated Power: 0.063W; Rated Voltage: 75VDC; Footprint: 0402; Pin Count: 2; Supplier 1: Digi-Key; Supplier Part Number 1: 311-2KLRCT-ND; Value: 2k; Tolerance: 1%; Mounting Technology: SMT; Temperature Range: -55C to 155C; Component Kind: Standard; Component Type: Standard
footprint RESC1005X40N
pins: 1, 2

## RCHIP-5K1-0603
designator R?, comment 5k1
5k1 res, 0603, 1%, 1/10W; Part Number: RCHIP-5K1-0603; Manufacture 1: Yageo; Manufacture Part Number 1: RC0603FR-075K1L; Component Group: Resistor; Case-EIA: 0603; Case-Metric: 1608; Rated Power: 0.1W; Rated Voltage: 75VDC; Footprint: 0603; Pin Count: 2; Supplier 1: Digi-Key; Supplier Part Number 1: 311-5.10KHRCT-ND; Value: 5k1; Tolerance: 1%; Mounting Technology: SMT; Temperature Range: -55C to 155C; Component Kind: Standard; Component Type: Standard
footprint RESC1608X55N
pins: 1, 2

## RCHIP-10K-0402
designator R?, comment 10k
10k res, 0402, 1%, 1/16W; Part Number: RCHIP-10K-0402; Manufacture 1: Yageo; Manufacture Part Number 1: RC0402FR-0710KL; Component Group: Resistor; Case-EIA: 0402; Case-Metric: 1005; Rated Power: 0.063W; Rated Voltage: 75VDC; Footprint: 0402; Pin Count: 2; Supplier 1: Digi-Key; Supplier Part Number 1: 311-10.0KLRCT-ND; Value: 10k; Tolerance: 1%; Mounting Technology: SMT; Temperature Range: -55C to 155C; Component Kind: Standard; Component Type: Standard
footprint RESC1005X40N
pins: 1, 2

## RCHIP-10R-0603
designator R?, comment 10R
10R res, 0603, 1%, 1/10W; Part Number: RCHIP-10R-0603; Manufacture 1: Yageo; Manufacture Part Number 1: RC0603FR-0710RL; Component Group: Resistor; Case-EIA: 0603; Case-Metric: 1608; Rated Power: 0.1W; Rated Voltage: 75VDC; Footprint: 0603; Pin Count: 2; Supplier 1: Digi-Key; Supplier Part Number 1: 311-10.0HRCT-ND; Value: 10R; Tolerance: 1%; Mounting Technology: SMT; Temperature Range: -55C to 155C; Component Kind: Standard; Component Type: Standard
footprint RESC1608X55N
pins: 1, 2

## RCHIP-12K-0402
designator R?, comment 12k
12k res, 0402, 1%, 1/16W; Part Number: RCHIP-12K-0402; Manufacture 1: Yageo; Manufacture Part Number 1: RC0402FR-0712KL; Component Group: Resistor; Case-EIA: 0402; Case-Metric: 1005; Rated Power: 0.063W; Rated Voltage: 75VDC; Footprint: 0402; Pin Count: 2; Supplier 1: Digi-Key; Supplier Part Number 1: 311-12.0KLRCT-ND; Value: 12k; Tolerance: 1%; Mounting Technology: SMT; Temperature Range: -55C to 155C; Component Kind: Standard; Component Type: Standard
footprint RESC1005X40N
pins: 1, 2

## RCHIP-12K-0603
designator R?, comment 12k
12k res, 0603, 1%, 1/10W; Part Number: RCHIP-12K-0603; Manufacture 1: Yageo; Manufacture Part Number 1: RC0603FR-0712KL; Component Group: Resistor; Case-EIA: 0603; Case-Metric: 1608; Rated Power: 0.1W; Rated Voltage: 75VDC; Footprint: 0603; Pin Count: 2; Supplier 1: Digi-Key; Supplier Part Number 1: 311-12.0KHRCT-ND; Value: 12k; Tolerance: 1%; Mounting Technology: SMT; Temperature Range: -55C to 155C; Component Kind: Standard; Component Type: Standard
footprint RESC1608X55N
pins: 1, 2

## RCHIP-15K-0402
designator R?, comment 15k
15k res, 0402, 1%, 1/16W; Part Number: RCHIP-15K-0402; Manufacture 1: Yageo; Manufacture Part Number 1: RC0402FR-0715KL; Component Group: Resistor; Case-EIA: 0402; Case-Metric: 1005; Rated Power: 0.063W; Rated Voltage: 75VDC; Footprint: 0402; Pin Count: 2; Supplier 1: Digi-Key; Supplier Part Number 1: 311-15.0KLRCT-ND; Value: 15k; Tolerance: 1%; Mounting Technology: SMT; Temperature Range: -55C to 155C; Component Kind: Standard; Component Type: Standard
footprint RESC1005X40N
pins: 1, 2

## RCHIP-22K-0402
designator R?, comment 22k
22k res, 0402, 1%, 1/16W; Part Number: RCHIP-22K-0402; Manufacture 1: Yageo; Manufacture Part Number 1: RC0402FR-0722KL; Component Group: Resistor; Case-EIA: 0402; Case-Metric: 1005; Rated Power: 0.063W; Rated Voltage: 75VDC; Footprint: 0402; Pin Count: 2; Supplier 1: Digi-Key; Supplier Part Number 1: 311-22.0KLRCT-ND; Value: 22k; Tolerance: 1%; Mounting Technology: SMT; Temperature Range: -55C to 155C; Component Kind: Standard; Component Type: Standard
footprint RESC1005X40N
pins: 1, 2

## RCHIP-22R-0402
designator R?, comment 22R
22R res, 0402, 1%, 1/16W; Part Number: RCHIP-22R-0402; Manufacture 1: Yageo; Manufacture Part Number 1: RC0402FR-0722RL; Component Group: Resistor; Case-EIA: 0402; Case-Metric: 1005; Rated Power: 0.063W; Rated Voltage: 75VDC; Footprint: 0402; Pin Count: 2; Supplier 1: Digi-Key; Supplier Part Number 1: 311-22.0LRCT-ND; Value: 22R; Tolerance: 1%; Mounting Technology: SMT; Temperature Range: -55C to 155C; Component Kind: Standard; Component Type: Standard
footprint RESC1005X40N
pins: 1, 2

## RCHIP-27R-0402
designator R?, comment 27R
27R res, 0402, 1%, 1/16W; Part Number: RCHIP-27R-0402; Manufacture 1: Yageo; Manufacture Part Number 1: RC0402FR-0727RL; Component Group: Resistor; Case-EIA: 0402; Case-Metric: 1005; Rated Power: 0.063W; Rated Voltage: 75VDC; Footprint: 0402; Pin Count: 2; Supplier 1: Digi-Key; Supplier Part Number 1: YAG3086CT-ND; Value: 27R; Tolerance: 1%; Mounting Technology: SMT; Temperature Range: -55C to 155C; Component Kind: Standard; Component Type: Standard
footprint RESC1005X40N
pins: 1, 2

## RCHIP-33R-0603
designator R?, comment 33R
33R res, 0603, 1%, 1/10W; Part Number: RCHIP-33R-0603; Manufacture 1: Yageo; Manufacture Part Number 1: RC0603FR-0733RL; Component Group: Resistor; Case-EIA: 0603; Case-Metric: 1608; Rated Power: 0.1W; Rated Voltage: 75VDC; Footprint: 0603; Pin Count: 2; Supplier 1: Digi-Key; Supplier Part Number 1: 311-33.0HRCT-ND; Value: 33R; Tolerance: 1%; Mounting Technology: SMT; Temperature Range: -55C to 155C; Component Kind: Standard; Component Type: Standard
footprint RESC1608X55N
footprint 741C083
pins: 1, 2

## RCHIP-47K-0402
designator R?, comment 47k
47k res, 0402, 1%, 1/16W; Part Number: RCHIP-47K-0402; Manufacture 1: Yageo; Manufacture Part Number 1: RC0402FR-0747KL; Component Group: Resistor; Case-EIA: 0402; Case-Metric: 1005; Rated Power: 0.063W; Rated Voltage: 75VDC; Footprint: 0402; Pin Count: 2; Supplier 1: Digi-Key; Supplier Part Number 1: 311-47.0KLRCT-ND; Value: 47k; Tolerance: 1%; Mounting Technology: SMT; Temperature Range: -55C to 155C; Component Kind: Standard; Component Type: Standard
footprint RESC1005X40N
pins: 1, 2

## RCHIP-75R-0805
designator R?, comment 75R
75R res, 0805, 1%, 1/8W; Part Number: RCHIP-75R-0805; Manufacture 1: Yageo; Manufacture Part Number 1: RC0805FR-0775RL; Component Group: Resistor; Case-EIA: 0805; Rated Power: 0.125W; Rated Voltage: 75VDC; Footprint: 0805; Pin Count: 2; Supplier 1: Digi-Key; Supplier Part Number 1: 311-75.0CRCT-ND; Value: 75R; Tolerance: 1%; Mounting Technology: SMT; Temperature Range: -55C to 155C; Component Kind: Standard; Component Type: Standard
footprint RESC2012X70N
pins: 1, 2

## RCHIP-100K-0402
designator R?, comment 100k
100k res, 0402, 1%, 1/16W; Part Number: RCHIP-100K-0402; Manufacture 1: Yageo; Manufacture Part Number 1: RC0402FR-07100KL; Component Group: Resistor; Case-EIA: 0402; Case-Metric: 1005; Rated Power: 0.063W; Rated Voltage: 75VDC; Footprint: 0402; Pin Count: 2; Supplier 1: Digi-Key; Supplier Part Number 1: 311-100KLRCT-ND; Value: 100k; Tolerance: 1%; Mounting Technology: SMT; Temperature Range: -55C to 155C; Component Kind: Standard; Component Type: Standard
footprint RESC1005X40N
pins: 1, 2

## RCHIP-100K-0603
designator R?, comment 100k
100k res, 0603, 1%, 1/10W; Part Number: RCHIP-100K-0603; Manufacture 1: Yageo; Manufacture Part Number 1: RC0603FR-07100KL; Component Group: Resistor; Case-EIA: 0603; Case-Metric: 1608; Rated Power: 0.1W; Rated Voltage: 75VDC; Footprint: 0603; Pin Count: 2; Supplier 1: Digi-Key; Supplier Part Number 1: 311-100KHRCT-ND; Value: 100k; Tolerance: 1%; Mounting Technology: SMT; Temperature Range: -55C to 155C; Component Kind: Standard; Component Type: Standard
footprint RESC1608X55N
pins: 1, 2

## RCHIP-120R-0603
designator R?, comment 120R
120R res, 0603, 1%, 1/10W; Part Number: RCHIP-120R-0603; Manufacture 1: Yageo; Manufacture Part Number 1: RC0603FR-07120RL; Component Group: Resistor; Case-EIA: 0603; Case-Metric: 1608; Rated Power: 0.1W; Rated Voltage: 75VDC; Footprint: 0603; Pin Count: 2; Supplier 1: Digi-Key; Supplier Part Number 1: 311-120HRCT-ND; Value: 120R; Tolerance: 1%; Mounting Technology: SMT; Temperature Range: -55C to 155C; Component Kind: Standard; Component Type: Standard
footprint RESC1608X55N
pins: 1, 2

## RCHIP-150K-0603
designator R?, comment 150k
150k res, 0603, 1%, 1/10W; Part Number: RCHIP-150K-0603; Manufacture 1: Yageo; Manufacture Part Number 1: RC0603FR-07150KL; Component Group: Resistor; Case-EIA: 0603; Case-Metric: 1608; Rated Power: 0.1W; Rated Voltage: 75VDC; Footprint: 0603; Pin Count: 2; Supplier 1: Digi-Key; Supplier Part Number 1: 311-150KHRCT-ND; Value: 150k; Tolerance: 1%; Mounting Technology: SMT; Temperature Range: -55C to 155C; Component Kind: Standard; Component Type: Standard
footprint RESC1608X55N
pins: 1, 2

## RCHIP-180R-0402
designator R?, comment 180R
180R res, 0402, 1%, 1/16W; Part Number: RCHIP-180R-0402; Manufacture 1: Yageo; Manufacture Part Number 1: RC0402FR-07180RL; Component Group: Resistor; Case-EIA: 0402; Case-Metric: 1005; Rated Power: 0.063W; Rated Voltage: 75VDC; Footprint: 0402; Pin Count: 2; Supplier 1: Digi-Key; Supplier Part Number 1: 311-180LRCT-ND; Value: 180R; Tolerance: 1%; Mounting Technology: SMT; Temperature Range: -55C to 155C; Component Kind: Standard; Component Type: Standard
footprint RESC1005X40N
pins: 1, 2

## RCHIP-845R-0402
designator R?, comment 845R
845R res, 0402, 1%, 1/16W; Part Number: RCHIP-845R-0402; Manufacture 1: Yageo; Manufacture Part Number 1: RC0402FR-07845RL; Component Group: Resistor; Case-EIA: 0402; Case-Metric: 1005; Rated Power: 0.063W; Rated Voltage: 75VDC; Footprint: 0402; Pin Count: 2; Supplier 1: Digi-Key; Supplier Part Number 1: YAG3244CT-ND; Value: 845R; Tolerance: 1%; Mounting Technology: SMT; Temperature Range: -55C to 155C; Component Kind: Standard; Component Type: Standard
footprint RESC1005X40N
pins: 1, 2

## RCHIP-DNM-0402
designator R?, comment DNM
Part Number: RCHIP-DNM-0402; Component Group: Resistor; Case-EIA: 0402; Case-Metric: 1005; Footprint: 0402; Pin Count: 2; Value: DNM; Component Kind: Standard; Component Type: Standard
footprint RESC1005X40N
pins: 1, 2

## RCHIP-DNM-0603
designator R?, comment DNM RCHIP
Do Not Mount Resistor; Part Number: RCHIP-DNM-0603; Case-EIA: 0603; Case-Metric: 1608; Component Group: Resistor; Footprint: 0603; Pin Count: 2; Mounting Technology: SMT; Component Kind: Standard; Component Type: Standard
footprint RESC1608X55N
pins: 1, 2

## REF3012AIDBZT
designator U?
IC VREF SERIES 0.2% SOT23-3; Manufacture 1: Texas Instruments; Output Voltage: 1.25V; Max Input Voltage: 5.5V; Max Output Current: 25mA; Min Input Voltage: 1.8V; Nominal Supply Current: 42uA; Temperature Coefficient: 50ppm/°C; Number of Channels: 1; Quiescent Current: 50uA; Min Output Voltage: 1.248V; Reference Type: Series,Fixed; Component Group: Analog IC; PP Material Stack: 0; Supplier 1: Digi-Key; RoHS: Yes; Category: Voltage References; Stock 1: 7831; Pricing 1: 1=1.18000, 10=1.05300, 25=0.99960, 100=0.76760 (USD); Case/Package: SOT-23; Number of Pins: 3; Min Operating Temperature: -40°C; Max Operating Temperature: 125°C; Packaging: Tape and Reel; Package Quantity: 1; Output Current: 25mA; Max Supply Current: 50uA; Max Output Voltage: 1.25V; Reference Voltage: 1.25V; Termination: SMD/SMT; Length: 2.92mm; Width: 1.3mm; Height: 1mm; Radiation Hardening: No; REACH SVHC: No SVHC; Lead Free: Lead Free; ComponentLink3URL: https://datasheet.ciiva.com/2007/ref3012-2007154.pdf?src-supplier=Digi-Key; ComponentLink3Description: https://datasheet.ciiva.com/2007/ref3012-2007154.pdf?src-supplier=Digi-Key; ComponentLink4URL: https://datasheet.ciiva.com/2007/ref3012-2007155.pdf?src-supplier=Digi-Key; ComponentLink4Description: https://datasheet.ciiva.com/2007/ref3012-2007155.pdf?src-supplier=Digi-Key; ComponentLink5URL: https://datasheet.ciiva.com/3235/ref3033-3235533.pdf?src-supplier=Avnet; ComponentLink5Description: https://datasheet.ciiva.com/3235/ref3033-3235533.pdf?src-supplier=Avnet; ComponentLink6URL: https://datasheet.ciiva.com/3235/ref3033-3235534.pdf?src-supplier=Avnet; ComponentLink6Description: https://datasheet.ciiva.com/3235/ref3033-3235534.pdf?src-supplier=Avnet; .Checked SCH: *; .Checked PCB: *; Supplier Part Number 1: REF3012AIDBZTTR-ND; Manufacturer Part Number: REF3012AIDBZT; Part Number: REF3012AIDBZT; Footprint: SOT23-3; Manufacture Part Number 1: REF3012AIDBZT; Pin Count: 3; Mounting Technology: SMT; Component Kind: Standard; Component Type: Standard; PP Rotation: 0
footprint SOT95P237X112-3N (SOT23, 3-Leads, Body 2.92x2.37mm, Pitch 0.95mm, IPC Medium Density)
pins: 1 IN, 2 OUT, 3 GND
text: 1.25 V REF

## RT8058
designator U?
Switching supply controller, 2A; Manufacture 1: Richtek; Component Group: Analog IC; PP Material Stack: 0; Part Number: RT8058; Footprint: QFN16; Manufacture Part Number 1: RT8058; Pin Count: 17; Component Kind: Standard; Component Type: Standard; PP Rotation: 0
footprint QFN16_50P300X300X100_HS-17M
pins: 1 PGND, 2 PGND, 3 PGND, 4 FB, 5 GND, 6 NC, 7 EN, 8 NC, 9 VDD, 10 PVDD, 11 PVDD, 12 PVDD, 13 LX, 14 LX, 15 LX, 16 NC, 17 PGND

## SC0914_7_
designator U?
Connector; Manufacturer_Name: RASPBERRY-PI; Manufacturer_Part_Number: SC0914(7); Datasheet Link: https://www.mouser.com/datasheet/2/635/rp2040_datasheet-3048960.pdf; Height: 0.9mm; Mouser Part Number: 358-SC09147; Mouser Price/Stock: https://www.mouser.co.uk/ProductDetail/Raspberry-Pi/SC09147?qs=T%252BzbugeAwjhSpdbCB4ve%252Bg%3D%3D
footprint QFN40P700X700X90-57N-D (Footprint not found)
pins: 1 IOVDD_1, 2 GPIO0, 3 GPIO1, 4 GPIO2, 5 GPIO3, 6 GPIO4, 7 GPIO5, 8 GPIO6, 9 GPIO7, 10 IOVDD_2, 11 GPIO8, 12 GPIO9, 13 GPIO10, 14 GPIO11, 15 GPIO12, 16 GPIO13, 17 GPIO14, 18 GPIO15, 19 TESTEN, 20 XIN, 21 XOUT, 22 IOVDD_3, 23 DVDD_1, 24 SWCLK, 25 SWDIO, 26 RUN, 27 GPIO16, 28 GPIO17, 29 GPIO18, 30 GPIO19, 31 GPIO20, 32 GPIO21, 33 IOVDD_4, 34 GPIO22, 35 GPIO23, 36 GPIO24, 37 GPIO25, 38 GPIO26/ADC0, 39 GPIO27/ADC1, 40 GPIO28/ADC2, 41 GPIO29/ADC3, 42 IOVDD_5, 43 ADC_AVDD, 44 VREG_VIN, 45 VREG_VOUT, 46 USB_DM, 47 USB_DP, 48 USB_VDD, 49 IOVDD_6, 50 DVDD_2, 51 QSPI_SD3, 52 QSPI_SCLK, 53 QSPI_SD0, 54 QSPI_SD2, 55 QSPI_SD1, 56 QSPI_SS_N, 57 GND

## SJ_2S_NO
designator SJ?, comment NO  (no BOM)
Solder Jumper, NO; Part Number: SJ_2S_NO; Component Group: PCB Feature; Footprint: SJ_2S_NO; Pin Count: 2; Mounting Technology: COPPER; Component Type: Standard (No BOM)
footprint SJ_2S_NO
pins: 1, 2

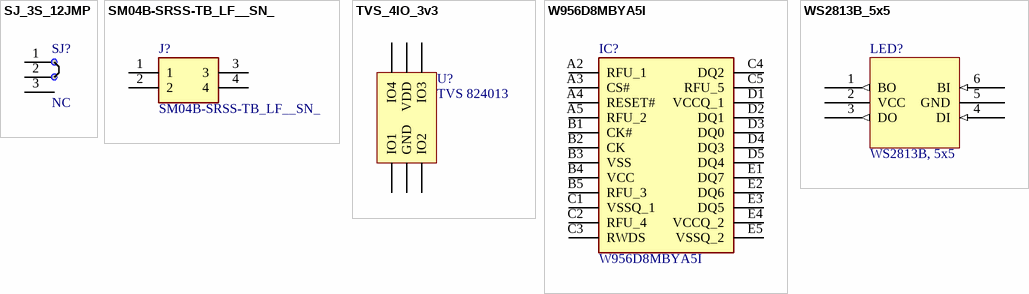
[diagram p4: symbols SJ_3S_12JMP to WS2813B_5x5]

## SJ_3S_12JMP
designator SJ?, comment NC  (no BOM)
Solder Jumper, NC; Part Number: SJ_3S_12JMP; Component Group: PCB Feature; Footprint: SJ_3S_NC12; Pin Count: 3; Mounting Technology: COPPER; Component Type: Standard (No BOM)
footprint SJ_3S_NC12
pins: 1, 2, 3

## SM04B-SRSS-TB_LF__SN_
designator J?
Connector; Manufacturer_Name: JST (JAPAN SOLDERLESS TERMINALS); Manufacturer_Part_Number: SM04B-SRSS-TB(LF)(SN); Datasheet Link: http://www.jst-mfg.com/product/pdf/eng/eSH.pdf; Arrow Part Number: SM04B-SRSS-TB(LF)(SN); Arrow Price/Stock: https://www.arrow.com/en/products/sm04b-srss-tb-lf-sn/jst-manufacturing?region=europe
footprint SM04B-SRSS-TB(LFSN) (Footprint not found)
pins: 1, 2, 3, 4

## TVS_4IO_3v3
designator U?, comment TVS 824013
TVS DIODE 3.3V 6V SOT23-6L; Part Number: TVS_4IO_3v3; Manufacture 1: Wurth Electronics Inc.; Manufacture Part Number 1: 824013; Component Group: Analog IC; PP Material Stack: 0; Footprint: SOT-23-6; Pin Count: 6; Supplier 1: Digi-Key; Supplier Part Number 1: 732-4466-1-ND; Mounting Technology: SMT; RoHS: Yes; Component Kind: Standard; Component Type: Standard; PP Rotation: 0
footprint SOT95P280X145-6N
pins: 1 IO1, 2 GND, 3 IO2, 4 IO3, 5 VDD, 6 IO4

## W956D8MBYA5I
designator IC?
Integrated Circuit; Manufacturer_Name: Winbond; Datasheet Link: https://www.winbond.com/hq/search-resource-file.jsp?partNo=W956D8MBYA5I&type=datasheet; Height: 1.2mm; Manufacturer_Part_Number: W956D8MBYA5I; Mouser Part Number: 454-W956D8MBYA5I; Mouser Price/Stock: https://www.mouser.co.uk/ProductDetail/Winbond/W956D8MBYA5I?qs=YwPsRIUVAOcvNB%2FM4WBgTQ%3D%3D
footprint BGA24C100P5X5_600X800X120 (Footprint not found)
pins: A2 RFU_1, A3 CS#, A4 RESET#, A5 RFU_2, B1 CK#, B2 CK, B3 VSS, B4 VCC, B5 RFU_3, C1 VSSQ_1, C2 RFU_4, C3 RWDS, C4 DQ2, C5 RFU_5, D1 VCCQ_1, D2 DQ1, D3 DQ0, D4 DQ3, D5 DQ4, E1 DQ7, E2 DQ6, E3 DQ5, E4 VCCQ_2, E5 VSSQ_2

## WS2813B_5x5
designator LED?, comment WS2813B, 5x5
WS2813B, 5x5 SMD Neopixel; Part Number: WS2813B_5x5; Manufacture 1: Seeed Studio; Manufacture Part Number 1: 601000200; Component Group: Optical; PP Material Stack: 0; Footprint: 5x5mm SMD; Pin Count: 6; Component Kind: Standard; Component Type: Standard; PP Rotation: 0; PP Rotation1: 0
footprint WS2813B_5x5
pins: 1 BO (out), 2 VCC, 3 DO (out), 4 DI (in), 5 GND, 6 BI (in)